# Altium footprint library SIPF24_2_MM_W_GL_CPU.PcbLib: 1 footprints
Each footprint in its own frame and in the unit in brackets; x right, y up, seen from the top. Pads: shape width x height; smd on the part's side, far side on the other; paste and mask are expansions set on the pad; w line width, h text height; cw(c..) or ccw(c..) is an arc to the next point about the centre after c.
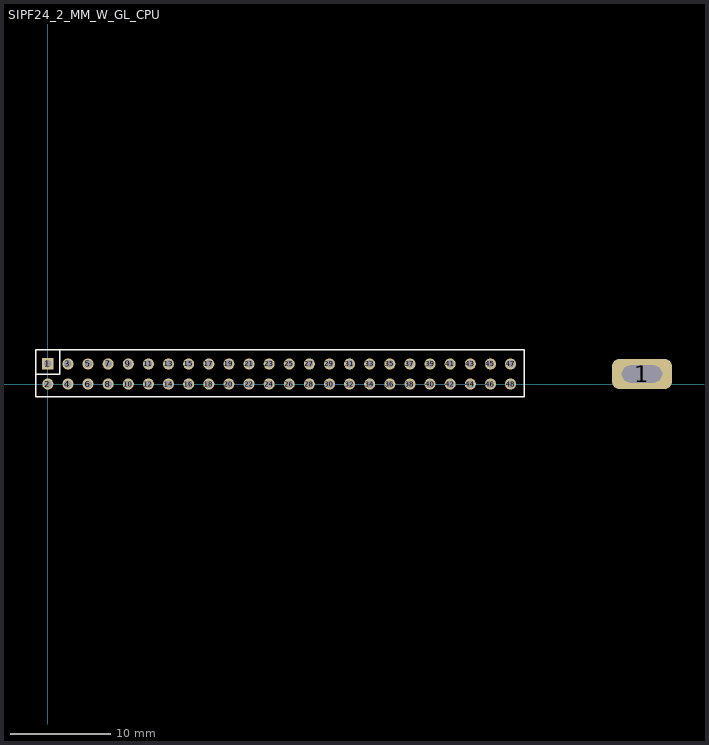
[diagram p0: the footprint, top view; thin cyan lines are the x and y axes]

## SIPF24_2_MM_W_GL_CPU [mm]
pads (49):
  rect 1.15x1.15 hole 0.75: 1(0,2)
  rrect50% 6x3 hole 1.7 slot 4 at 0 deg: 1(59.068,1)
  round 1.1 hole 0.75: 2(0,0) 3(2,2) 4(2,0) 5(4,2) 6(4,0) 7(6,2) 8(6,0) 9(8,2) 10(8,0) 11(10,2) 12(10,0) 13(12,2) 14(12,0) 15(14,2) 16(14,0) 17(16,2) 18(16,0) 19(18,2) 20(18,0) 21(20,2) 22(20,0) 23(22,2) 24(22,0) 25(24,2) 26(24,0) 27(26,2) 28(26,0) 29(28,2) 30(28,0) 31(30,2) 32(30,0) 33(32,2) 34(32,0) 35(34,2) 36(34,0) 37(36,2) 38(36,0) 39(38,2) 40(38,0) 41(40,2) 42(40,0) 43(42,2) 44(42,0) 45(44,2) 46(44,0) 47(46,2) 48(46,0)
Top Overlay:
  lines w0.127: -1.194,1 1.182,1 1.182,3.416 ; -1.194,-1.257 -1.194,3.416 47.358,3.416 47.358,-1.257 -1.194,-1.257
3D body "MODEM.step": height 47.74, standoff 1.51, extent -11.045,1.762 63.56,11.227
3D body "female_header_a-bl200-dg-g48d.stp": height 4, standoff -2.8, extent -1.232,-1.181 47.268,3.319
3D body "GL_CPU.step": height 48.22, standoff -5, extent -1.664,-13.173 63.386,7.533